# Altium footprint library Electronic Devices_LIB.PcbLib: 410 footprints (part 13 of 26)
Each footprint in its own frame and in the unit in brackets; x right, y up, seen from the top. Pads: shape width x height; smd on the part's side, far side on the other; paste and mask are expansions set on the pad; w line width, h text height; cw(c..) or ccw(c..) is an arc to the next point about the centre after c.
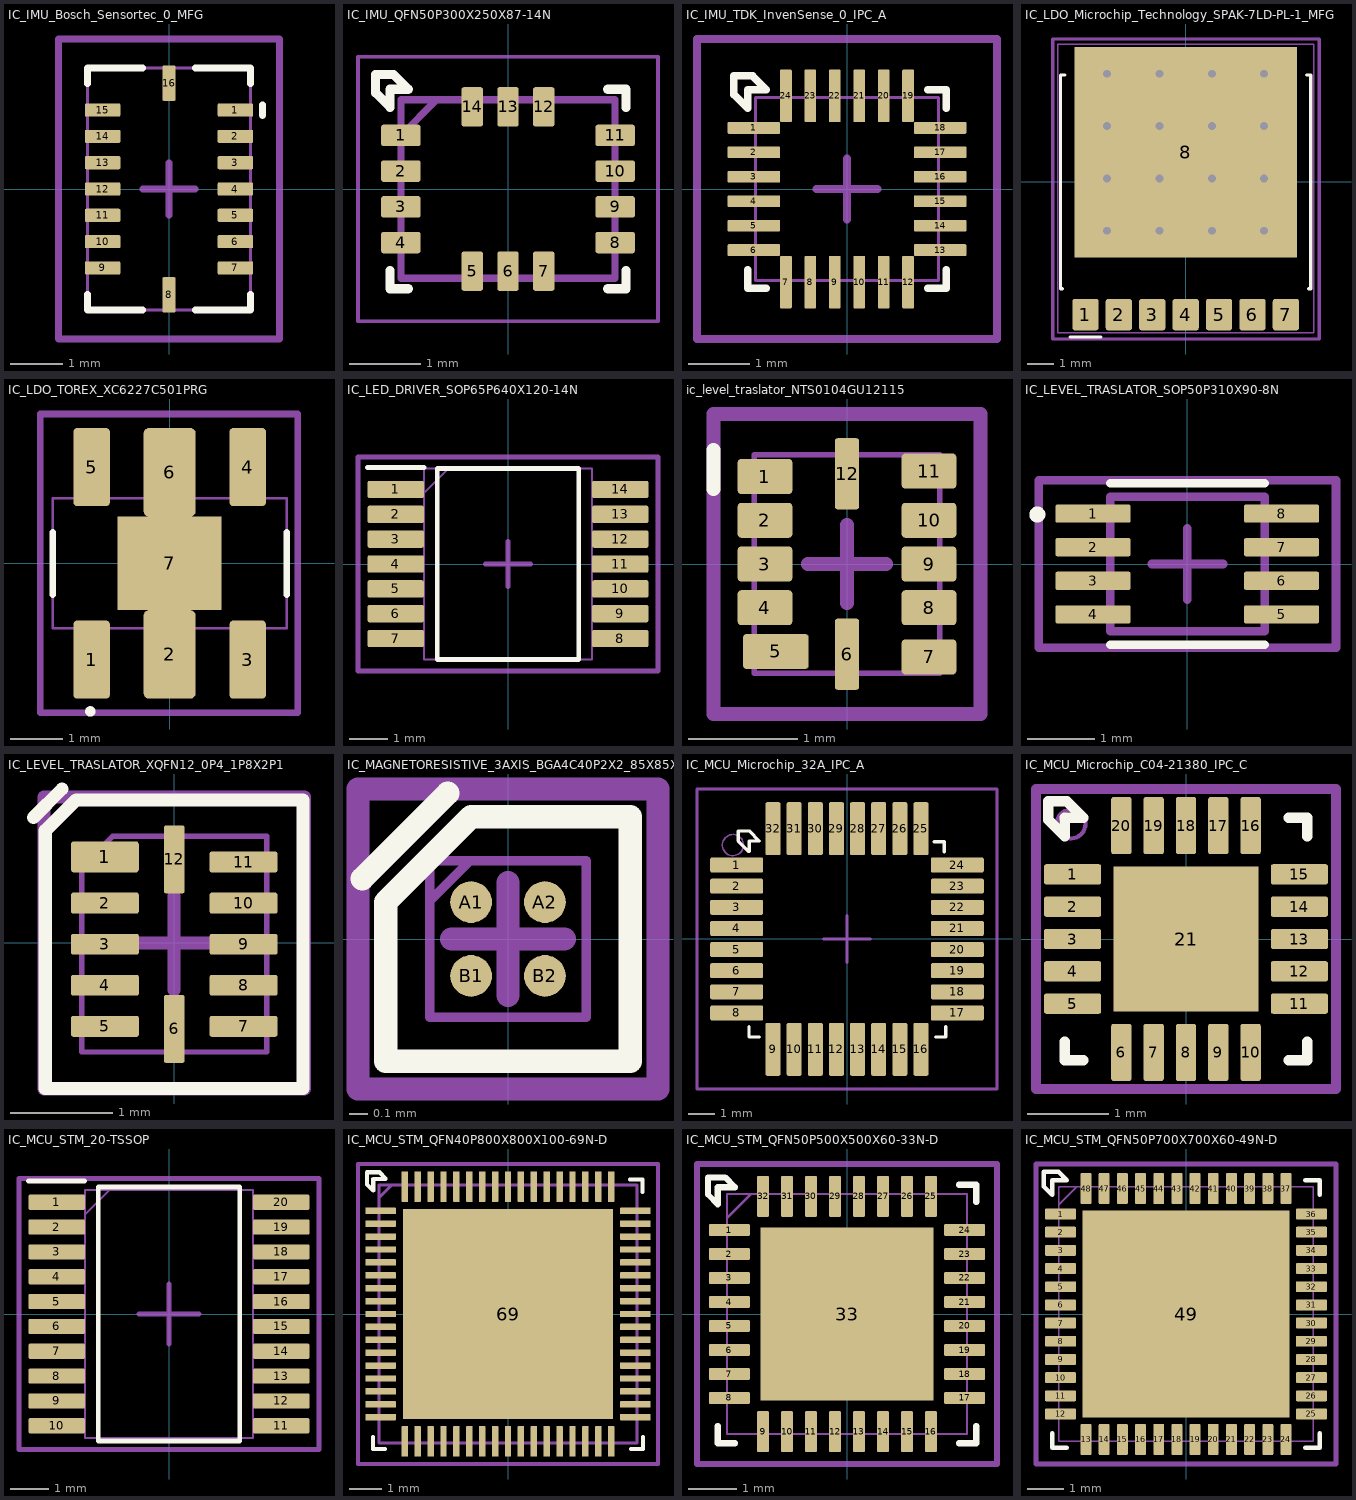
[diagram p12: the footprints below, top view; thin cyan lines are the x and y axes]

## IC_IMU_Bosch_Sensortec_0_MFG [mm] "16-LGA (4.5x3)"
pads (16):
  rrect20% 0.675x0.25 smd paste+0: 1(1.262,1.5) 2(1.262,1) 3(1.262,0.5) 4(1.262,0) 5(1.262,-0.5) 6(1.262,-1) 7(1.262,-1.5) 9(-1.262,-1.5) 10(-1.262,-1) 11(-1.262,-0.5) 12(-1.262,0) 13(-1.262,0.5) 14(-1.262,1) 15(-1.262,1.5)
  rrect20% 0.25x0.675 smd paste+0: 8(0,-2.013) 16(0,2.013)
Top Overlay:
  lines w0.127: -1.55,-2 -1.55,-2.3 -0.5,-2.3 ; -1.55,2 -1.55,2.3 -0.5,2.3 ; 0.5,-2.3 1.55,-2.3 1.55,-2 ; 0.5,2.3 1.55,2.3 1.55,2 ; 1.778,1.397 1.778,1.6
Top Assembly:
  lines w0.051: -1.55,-2.3 -1.55,2.3 1.55,2.3 1.55,-2.3 -1.55,-2.3
  text ".Designator" at -2.362,-0.186 h0.51
Top Courtyard:
  lines w0.127: -0.5,0 0.5,0 ; 0,-0.5 0,0.5 ; -2.1,-2.85 -2.1,2.85 2.1,2.85 2.1,-2.85 -2.1,-2.85
3D body "IC_Bosch_Sensortec_BMI055_eec.STEP": height 0.25, standoff 0, extent -2.1,-2.85 2.1,2.85

## IC_IMU_QFN50P300X250X87-14N [mm] "14-LGA (2.5x3)"
height 0.83
pads (14):
  rrect20% 0.55x0.3 smd mask+0.076: 1(-1.5,0.75) 2(-1.5,0.25) 3(-1.5,-0.25) 4(-1.5,-0.75) 8(1.5,-0.75) 9(1.5,-0.25) 10(1.5,0.25) 11(1.5,0.75)
  rrect20% 0.3x0.55 smd mask+0.076: 5(-0.5,-1.15) 6(0,-1.15) 7(0.5,-1.15) 12(0.5,1.15) 13(0,1.15) 14(-0.5,1.15)
Top Overlay:
  lines w0.127: -1.651,-1.143 -1.651,-1.397 -1.397,-1.397 ; 1.397,-1.397 1.651,-1.397 1.651,-1.143 ; 1.397,1.397 1.651,1.397 1.651,1.143 ; -1.854,1.346 -1.854,1.6 -1.6,1.6 -1.397,1.397 -1.651,1.397 -1.651,1.143 -1.854,1.346
Top 3D Body:
  lines w0.1: -1.5,0.75 -1,1.25 ; -1.5,-1.25 -1.5,1.25 1.5,1.25 1.5,-1.25 -1.5,-1.25
Mechanical 15:
  lines w0.05: -2.1,-1.85 -2.1,1.85 2.1,1.85 2.1,-1.85 -2.1,-1.85
3D body "BMI270.stp": height 0.87, standoff 0, extent -1.55,-1.3 1.55,1.3

## IC_IMU_TDK_InvenSense_0_IPC_A [mm] "QFN 3.0x3.0x0.9"
height 1
pads (24):
  rrect20% 0.861x0.192 smd: 1(-1.526,1) 2(-1.526,0.6) 3(-1.526,0.2) 4(-1.526,-0.2) 5(-1.526,-0.6) 6(-1.526,-1) 13(1.526,-1) 14(1.526,-0.6) 15(1.526,-0.2) 16(1.526,0.2) 17(1.526,0.6) 18(1.526,1)
  rrect20% 0.192x0.861 smd: 7(-1,-1.526) 8(-0.6,-1.526) 9(-0.2,-1.526) 10(0.2,-1.526) 11(0.6,-1.526) 12(1,-1.526) 19(1,1.526) 20(0.6,1.526) 21(0.2,1.526) 22(-0.2,1.526) 23(-0.6,1.526) 24(-1,1.526)
Top Overlay:
  lines w0.127: -1.626,-1.321 -1.626,-1.626 -1.321,-1.626 ; 1.321,-1.626 1.626,-1.626 1.626,-1.321 ; 1.321,1.626 1.626,1.626 1.626,1.321 ; -1.854,1.549 -1.854,1.854 -1.549,1.854 -1.321,1.626 -1.626,1.626 -1.626,1.321 -1.854,1.549
Top Assembly:
  lines w0.051: -1.5,-1.5 1.5,-1.5 1.5,1.5 -1.5,1.5 -1.5,-1.5
  text ".Designator" at -2.667,-0.009 h0.51
Top Courtyard:
  lines w0.127: -0.5,0 0.5,0 ; 0,-0.5 0,0.5 ; -2.456,-2.456 -2.456,2.456 2.456,2.456 2.456,-2.456 -2.456,-2.456
3D body "IC_TDK_InvenSense_ICM-20948_eec.STEP": height 0.25, standoff 0, extent -2.456,-2.456 2.456,2.456

## IC_LDO_Microchip_Technology_SPAK-7LD-PL-1_MFG [mm]
pads (8):
  rrect20% 1x1.2 smd paste+0: 1(-3.81,-5.04) 2(-2.54,-5.04) 3(-1.27,-5.04) 4(0,-5.04) 5(1.27,-5.04) 6(2.54,-5.04) 7(3.81,-5.04)
  rect 8.45x8 smd paste-1000 mask+0: 8(0,1.13)
via -2.985,4.115 diameter 0.6 hole 0.3
via -0.995,4.115 diameter 0.6 hole 0.3
via 0.995,4.115 diameter 0.6 hole 0.3
via 2.985,4.115 diameter 0.6 hole 0.3
via -2.985,2.125 diameter 0.6 hole 0.3
via -0.995,2.125 diameter 0.6 hole 0.3
via 0.995,2.125 diameter 0.6 hole 0.3
via 2.985,2.125 diameter 0.6 hole 0.3
via -2.985,0.135 diameter 0.6 hole 0.3
via -0.995,0.135 diameter 0.6 hole 0.3
via 0.995,0.135 diameter 0.6 hole 0.3
via 2.985,0.135 diameter 0.6 hole 0.3
via -2.985,-1.855 diameter 0.6 hole 0.3
via -0.995,-1.855 diameter 0.6 hole 0.3
via 0.995,-1.855 diameter 0.6 hole 0.3
via 2.985,-1.855 diameter 0.6 hole 0.3
Top Overlay:
  lines w0.127: -4.685,-4.065 -4.76,-4.065 -4.76,4.065 -4.6,4.065 ; -4.394,-5.893 -3.226,-5.893 ; 4.6,4.065 4.76,4.065 4.76,-4.065 4.685,-4.065
Top Paste:
  rectangle: -3.735,3.365 -2.235,4.865
  rectangle: -1.745,3.365 -0.245,4.865
  rectangle: 0.245,3.365 1.745,4.865
  rectangle: 2.235,3.365 3.735,4.865
  rectangle: -3.735,1.375 -2.235,2.875
  rectangle: -1.745,1.375 -0.245,2.875
  rectangle: 0.245,1.375 1.745,2.875
  rectangle: 2.235,1.375 3.735,2.875
  rectangle: -3.735,-0.615 -2.235,0.885
  rectangle: -1.745,-0.615 -0.245,0.885
  rectangle: 0.245,-0.615 1.745,0.885
  rectangle: 2.235,-0.615 3.735,0.885
  rectangle: -3.735,-2.605 -2.235,-1.105
  rectangle: -1.745,-2.605 -0.245,-1.105
  rectangle: 0.245,-2.605 1.745,-1.105
  rectangle: 2.235,-2.605 3.735,-1.105
Top Assembly:
  lines w0.051: -4.86,-5.74 4.86,-5.74 4.86,5.23 -4.86,5.23 -4.86,-5.74
  text ".Designator" at -2.54,-0.212 h0.51
Top Courtyard:
  lines w0.127: -0.5,0 0.5,0 ; 0,-0.5 0,0.5 ; -5.055,-5.969 5.08,-5.969 5.08,5.436 -5.055,5.436 -5.055,-5.969
3D body "IC_Microchip_Technology_MIC69502WR-TR_eec.STEP": height 0.25, standoff 0, extent -4.86,-5.74 4.86,5.23

## IC_LDO_TOREX_XC6227C501PRG [mm]
pads (7):
  rrect20% 0.7x1.5 smd: 1(-1.5,-1.85) 3(1.5,-1.85) 4(1.5,1.85) 5(-1.5,1.85)
  rrect20% 1x1.7 smd: 2(0,-1.75) 6(0,1.75)
  rect 2x1.8 smd: 7(0,0)
Top Overlay:
  lines w0.1: -1.574,-2.845 ccw(c-1.524,-2.845) -1.474,-2.845 ccw(c-1.524,-2.845) -1.574,-2.845
  lines w0.127: -2.25,-0.6 -2.25,0.6 ; 2.25,-0.6 2.25,0.6
Mechanical 1:
  text ".Designator" at -2.515,-0.059 h0.51
Top Assembly:
  lines w0.051: -2.25,-1.25 2.25,-1.25 2.25,1.25 -2.25,1.25 -2.25,-1.25
Top Courtyard:
  lines w0.127: -0.813,0 0,0 ; 0,-0.813 0,0 ; 0,0.813 0,0 ; 0.813,0 0,0 ; -2.489,-2.87 2.464,-2.87 2.464,2.87 -2.489,2.87 -2.489,-2.87
3D body "XC6227C331PR-G.stp": height 1.7, standoff 0, extent -2.25,-1.25 2.25,1.25

## IC_LED_DRIVER_SOP65P640X120-14N [mm] "14-TSSOP (0.173\", 4.40mm Width)"
height 0.34
pads (14):
  rrect20% 1.475x0.45 smd mask+0.076: 1(-2.938,1.95) 2(-2.938,1.3) 3(-2.938,0.65) 4(-2.938,0) 5(-2.938,-0.65) 6(-2.938,-1.3) 7(-2.938,-1.95) 8(2.938,-1.95) 9(2.938,-1.3) 10(2.938,-0.65) 11(2.938,0) 12(2.938,0.65) 13(2.938,1.3) 14(2.938,1.95)
Top Overlay:
  lines w0.127: -3.675,2.525 -2.2,2.525 ; -1.85,-2.5 -1.85,2.5 1.85,2.5 1.85,-2.5 -1.85,-2.5
Top Assembly:
  lines w0.051: -2.2,1.85 -1.55,2.5 ; -2.2,-2.5 -2.2,2.5 2.2,2.5 2.2,-2.5 -2.2,-2.5
  text ".Designator" at -2.54,-0.288 h0.51
Top Courtyard:
  lines w0.127: -0.584,0 0,0 ; 0,-0.584 0,0 ; 0,0.584 0,0 ; 0.584,0 0,0 ; -3.925,-2.8 -3.925,2.8 3.925,2.8 3.925,-2.8 -3.925,-2.8
3D body "TCA6507PWR.stp": height 1.2, standoff 0, extent -3.2,-2.5 3.2,2.5

## ic_level_traslator_NTS0104GU12115 [mm] "12-XQFN (2x1.7)"
height 1.1
pads (12):
  rrect20% 0.5x0.32 smd: 1(-0.75,0.8) 2(-0.75,0.4) 3(-0.75,0) 4(-0.75,-0.4) 7(0.75,-0.85) 8(0.75,-0.4) 9(0.75,0) 10(0.75,0.4) 11(0.75,0.85)
  rrect20% 0.6x0.32 smd: 5(-0.65,-0.8)
  rrect20% 0.22x0.65 smd: 6(0,-0.825) 12(0,0.825)
Top Overlay:
  lines w0.127: -1.219,0.686 -1.219,1.041
Top Assembly:
  lines w0.051: -0.85,-1 0.85,-1 0.85,1 -0.85,1 -0.85,-1
Top Courtyard:
  lines w0.127: -0.356,0 0,0 ; 0,-0.356 0,0 ; 0,0.356 0,0 ; 0.356,0 0,0 ; -1.219,-1.372 1.219,-1.372 1.219,1.372 -1.219,1.372 -1.219,-1.372
3D body "XQFN12_SOT1174-1_NXP.step": height 0.51, standoff 0, extent -0.902,-1.054 0.902,1.054

## IC_LEVEL_TRASLATOR_SOP50P310X90-8N [mm]
pads (8):
  rrect20% 1.12x0.27 smd: 1(-1.405,0.75) 2(-1.405,0.25) 3(-1.405,-0.25) 4(-1.405,-0.75) 5(1.405,-0.75) 6(1.405,-0.25) 7(1.405,0.25) 8(1.405,0.75)
Top Overlay:
  circle w0.2: c-2.235,0.737 r0.019
  lines w0.127: -1.15,-1.205 1.15,-1.205 ; -1.15,1.205 1.15,1.205
Top Assembly:
  text ".Designator" at -2.54,-0.161 h0.51
Top Courtyard:
  lines w0.127: -0.533,0 0,0 ; 0,-0.533 0,0 ; 0,0.533 0,0 ; 0.533,0 0,0 ; -2.215,-1.25 -2.215,1.25 2.215,1.25 2.215,-1.25 -2.215,-1.25
Top 3D Body:
  lines w0.127: -1.15,-1 -1.15,1 1.15,1 1.15,-1 -1.15,-1
3D body "step_temp.STEP": height 0.9, standoff 0, extent -1.55,-1 1.55,1

## IC_LEVEL_TRASLATOR_XQFN12_0P4_1P8X2P1 [mil] "XQFN12_0P4_1P8X2P1"
height 43.31
pads (12):
  rrect20% 26x12 smd: 1(-26.57,32.97)
  rrect20% 26x8 smd: 2(-26.57,15.26) 3(-26.57,-0.49) 4(-26.57,-16.24) 5(-26.57,-31.99) 7(26.57,-31.99) 8(26.57,-16.24) 9(26.57,-0.49) 10(26.57,15.26) 11(26.57,31.01)
  rrect20% 8x26 smd: 6(0,-32.97) 12(0,31.99)
Top Overlay:
  lines w5: -54,48 -43,59 ; -49.43,-55.83 -49.43,43.04 -37.62,54.85 49.43,54.85 49.43,-55.83 -49.43,-55.83
Top Assembly:
  lines w2: -35.43,-41.83 -35.43,29.04 -23.62,40.85 35.43,40.85 35.43,-41.83 -35.43,-41.83
  text ".Designator" at -103,-5.34 h20
Top Courtyard:
  lines w5: -50,55 -50,-56 50,-56 50,56 -50,56 ; -18,0 0,0 ; 0,-18 0,0 ; 0,18 0,0 ; 18,0 0,0
3D body "XQFN12_SOT1174-1_NXP.step": height 20.12, standoff 0, extent -35.51,-41.5 35.51,41.5

## IC_MAGNETORESISTIVE_3AXIS_BGA4C40P2X2_85X85X60 [mm]
pads (4):
  round 0.226 smd: A1(-0.2,0.2) A2(0.2,0.2) B1(-0.2,-0.2) B2(0.2,-0.2)
Top Overlay:
  lines w0.127: -0.79,0.327 -0.327,0.79 ; -0.663,-0.663 0.663,-0.663 0.663,0.663 -0.2,0.663 -0.663,0.2 -0.663,-0.663
Top Assembly:
  lines w0.051: -0.425,0.205 -0.205,0.425 ; -0.425,-0.425 -0.425,0.425 0.425,0.425 0.425,-0.425 -0.425,-0.425
  text ".Designator" at -2.667,-0.161 h0.51
Top Courtyard:
  lines w0.127: -0.305,0 0,0 ; 0,-0.305 0,0 ; 0,0.305 0,0 ; 0.305,0 0,0 ; -0.813,-0.813 0.813,-0.813 0.813,0.813 -0.813,0.813 -0.813,-0.813
3D body "MMC5633NJL.stp": height 0.6, standoff 0, extent -0.425,-0.425 0.425,0.425

## IC_MCU_Microchip_32A_IPC_A [mm] "7x7x1.0 mm Body, 2.00 mm (TQFN)"
height 1.2
pads (32):
  rrect20% 2.004x0.566 smd paste+0: 1(-4.175,2.8) 2(-4.175,2) 3(-4.175,1.2) 4(-4.175,0.4) 5(-4.175,-0.4) 6(-4.175,-1.2) 7(-4.175,-2) 8(-4.175,-2.8) 17(4.175,-2.8) 18(4.175,-2) 19(4.175,-1.2) 20(4.175,-0.4) 21(4.175,0.4) 22(4.175,1.2) 23(4.175,2) 24(4.175,2.8)
  rrect20% 0.566x2.004 smd paste+0: 9(-2.8,-4.175) 10(-2,-4.175) 11(-1.2,-4.175) 12(-0.4,-4.175) 13(0.4,-4.175) 14(1.2,-4.175) 15(2,-4.175) 16(2.8,-4.175) 25(2.8,4.175) 26(2,4.175) 27(1.2,4.175) 28(0.4,4.175) 29(-0.4,4.175) 30(-1.2,4.175) 31(-2,4.175) 32(-2.8,4.175)
Top Overlay:
  lines w0.127: -3.708,-3.327 -3.708,-3.708 -3.327,-3.708 ; 3.302,3.683 3.683,3.683 3.683,3.302 ; 3.353,-3.708 3.734,-3.708 3.734,-3.327 ; -4.115,3.708 -4.115,4.089 -3.734,4.089 -3.696,4.089 -3.315,3.708 -3.696,3.708 -3.696,3.327 -3.734,3.327 -4.115,3.708
Top Assembly:
  circle w0.051: c-4.318,3.556 r0.402
  lines w0.051: -5.677,-5.677 5.677,-5.677 5.677,5.677 -5.677,5.677 -5.677,-5.677
  text ".Designator" at -2.489,-0.161 h0.51
Top Courtyard:
  lines w0.127: -0.889,0 0,0 ; 0,-0.889 0,0 ; 0,0.889 0,0 ; 0.889,0 0,0 ; -5.677,-5.677 5.677,-5.677 5.677,5.677 -5.677,5.677 -5.677,-5.677
3D body "IC_Microchip_ATMEGA168PB-AU_eec.STEP": height 0.25, standoff 0, extent -5.677,-5.677 5.677,5.677

## IC_MCU_Microchip_C04-21380_IPC_C [mm] "20-vqfn"
height 0.9
pads (21):
  rrect20% 0.706x0.25 smd paste+0 mask+0.076: 1(-1.403,0.8) 2(-1.403,0.4) 3(-1.403,0) 4(-1.403,-0.4) 5(-1.403,-0.8) 11(1.403,-0.8) 12(1.403,-0.4) 13(1.403,0) 14(1.403,0.4) 15(1.403,0.8)
  rrect20% 0.25x0.706 smd paste+0 mask+0.076: 6(-0.8,-1.403) 7(-0.4,-1.403) 8(0,-1.403) 9(0.4,-1.403) 10(0.8,-1.403) 16(0.8,1.403) 17(0.4,1.403) 18(0,1.403) 19(-0.4,1.403) 20(-0.8,1.403)
  rect 1.8x1.8 smd paste-1000 mask+0: 21(0,0)
Top Overlay:
  lines w0.127: -1.5,-1.271 -1.5,-1.5 -1.271,-1.5 ; 1.271,-1.5 1.5,-1.5 1.5,-1.271 ; 1.271,1.5 1.5,1.5 1.5,1.271 ; -1.703,1.475 -1.5,1.271 -1.5,1.5 -1.271,1.5 -1.475,1.703 -1.703,1.703 -1.703,1.474
Top Paste:
  rectangle: -0.569,-0.569 0.569,0.569
Top Assembly:
  circle w0.051: c-1.422,1.422 r0.178
  lines w0.051: -1.856,-1.856 -1.856,1.856 1.856,1.856 1.856,-1.856 -1.856,-1.856
  text ".Designator" at -2.616,-0.288 h0.51
Top Courtyard:
  lines w0.127: -0.508,0 0,0 ; 0,-0.508 0,0 ; 0,0.508 0,0 ; 0.508,0 0,0 ; -1.856,-1.856 -1.856,1.856 1.856,1.856 1.856,-1.856 -1.856,-1.856
3D body "IC_Microchip_ATTINY1616-MNR_eec.STEP": height 0.25, standoff 0, extent -1.856,-1.856 1.856,1.856

## IC_MCU_STM_20-TSSOP [mm] "20-TSSOP  (0.173\", 4.40mm Width) Pitch 0.65mm"
height 1.2
pads (20):
  rrect20% 1.475x0.4 smd: 1(-2.938,2.925) 2(-2.938,2.275) 3(-2.938,1.625) 4(-2.938,0.975) 5(-2.938,0.325) 6(-2.938,-0.325) 7(-2.938,-0.975) 8(-2.938,-1.625) 9(-2.938,-2.275) 10(-2.938,-2.925) 11(2.938,-2.925) 12(2.938,-2.275) 13(2.938,-1.625) 14(2.938,-0.975) 15(2.938,-0.325) 16(2.938,0.325) 17(2.938,0.975) 18(2.938,1.625) 19(2.938,2.275) 20(2.938,2.925)
Top Overlay:
  lines w0.127: -3.683,3.48 -2.21,3.48 ; -1.85,-3.327 -1.85,3.327 -0.925,3.327 0.925,3.327 1.85,3.327 1.85,-3.327 -1.85,-3.327
Top Assembly:
  lines w0.051: -2.2,2.6 -1.55,3.25 ; -2.2,-3.25 2.2,-3.25 2.2,3.25 -2.2,3.25 -2.2,-3.25
  text ".Designator" at -2.438,-0.288 h0.51
Top Courtyard:
  lines w0.127: -0.787,0 0,0 ; 0,-0.787 0,0 ; 0,0.787 0,0 ; 0.787,0 0,0 ; -3.925,-3.55 3.925,-3.55 3.925,3.55 -3.925,3.55 -3.925,-3.55
3D body "STM32F030F4P6TR.stp": height 1.2, standoff 0, extent -3.2,-3.25 3.2,3.25

## IC_MCU_STM_QFN40P800X800X100-69N-D [mm]
pads (69):
  rrect20% 0.95x0.2 smd: 1(-3.95,3.2) 2(-3.95,2.8) 3(-3.95,2.4) 4(-3.95,2) 5(-3.95,1.6) 6(-3.95,1.2) 7(-3.95,0.8) 8(-3.95,0.4) 9(-3.95,0) 10(-3.95,-0.4) 11(-3.95,-0.8) 12(-3.95,-1.2) 13(-3.95,-1.6) 14(-3.95,-2) 15(-3.95,-2.4) 16(-3.95,-2.8) 17(-3.95,-3.2) 35(3.95,-3.2) 36(3.95,-2.8) 37(3.95,-2.4) 38(3.95,-2) 39(3.95,-1.6) 40(3.95,-1.2) 41(3.95,-0.8) 42(3.95,-0.4) 43(3.95,0) 44(3.95,0.4) 45(3.95,0.8) 46(3.95,1.2) 47(3.95,1.6) 48(3.95,2) 49(3.95,2.4) 50(3.95,2.8) 51(3.95,3.2)
  rrect20% 0.2x0.95 smd: 18(-3.2,-3.95) 19(-2.8,-3.95) 20(-2.4,-3.95) 21(-2,-3.95) 22(-1.6,-3.95) 23(-1.2,-3.95) 24(-0.8,-3.95) 25(-0.4,-3.95) 26(0,-3.95) 27(0.4,-3.95) 28(0.8,-3.95) 29(1.2,-3.95) 30(1.6,-3.95) 31(2,-3.95) 32(2.4,-3.95) 33(2.8,-3.95) 34(3.2,-3.95) 52(3.2,3.95) 53(2.8,3.95) 54(2.4,3.95) 55(2,3.95) 56(1.6,3.95) 57(1.2,3.95) 58(0.8,3.95) 59(0.4,3.95) 60(0,3.95) 61(-0.4,3.95) 62(-0.8,3.95) 63(-1.2,3.95) 64(-1.6,3.95) 65(-2,3.95) 66(-2.4,3.95) 67(-2.8,3.95) 68(-3.2,3.95)
  rect 6.5x6.5 smd: 69(0,0)
Top Overlay:
  lines w0.127: -4.191,-3.81 -4.191,-4.191 -3.81,-4.191 ; 3.785,4.166 4.166,4.166 4.166,3.785 ; 3.81,-4.191 4.191,-4.191 4.191,-3.81 ; -4.369,4.013 -4.369,4.394 -3.988,4.394 -3.797,4.204 -3.797,4.191 -4.178,4.191 -4.178,3.823 -4.369,4.013
Top Assembly:
  text ".Designator" at -2.438,-0.186 h0.51
Top Courtyard:
  lines w0.127: -0.483,0 0,0 ; 0,-0.483 0,0 ; 0,0.483 0,0 ; 0.483,0 0,0 ; -4.65,-4.65 4.65,-4.65 4.65,4.65 -4.65,4.65 -4.65,-4.65
Top 3D Body:
  lines w0.1: -4,3.6 -3.6,4 ; -4,-4 4,-4 4,4 -4,4 -4,-4
3D body "STM32H573RIV6.stp": height 1, standoff 0, extent -4.05,-4.05 4.05,4.05

## IC_MCU_STM_QFN50P500X500X60-33N-D [mm] "32-UFQFPN (5x5)"
height 0.6
pads (33):
  rrect20% 0.85x0.25 smd: 1(-2.45,1.75) 2(-2.45,1.25) 3(-2.45,0.75) 4(-2.45,0.25) 5(-2.45,-0.25) 6(-2.45,-0.75) 7(-2.45,-1.25) 8(-2.45,-1.75) 17(2.45,-1.75) 18(2.45,-1.25) 19(2.45,-0.75) 20(2.45,-0.25) 21(2.45,0.25) 22(2.45,0.75) 23(2.45,1.25) 24(2.45,1.75)
  rrect20% 0.25x0.85 smd: 9(-1.75,-2.45) 10(-1.25,-2.45) 11(-0.75,-2.45) 12(-0.25,-2.45) 13(0.25,-2.45) 14(0.75,-2.45) 15(1.25,-2.45) 16(1.75,-2.45) 25(1.75,2.45) 26(1.25,2.45) 27(0.75,2.45) 28(0.25,2.45) 29(-0.25,2.45) 30(-0.75,2.45) 31(-1.25,2.45) 32(-1.75,2.45)
  rect 3.6x3.6 smd: 33(0,0)
Top Overlay:
  lines w0.127: -2.692,-2.337 -2.692,-2.692 -2.337,-2.692 ; 2.337,-2.692 2.692,-2.692 2.692,-2.337 ; 2.337,2.692 2.692,2.692 2.692,2.337 ; -2.896,2.489 -2.896,2.845 -2.54,2.845 -2.337,2.642 -2.692,2.642 -2.692,2.286 -2.896,2.489
Top Assembly:
  lines w0.051: -2.5,2 -2,2.5 ; -2.5,-2.5 -2.5,2.5 2.5,2.5 2.5,-2.5 -2.5,-2.5
  text ".Designator" at -2.616,0.093 h0.51
Top Courtyard:
  lines w0.127: -0.66,0 0,0 ; 0,-0.66 0,0 ; 0,0.66 0,0 ; 0.66,0 0,0 ; -3.125,-3.125 -3.125,3.125 3.125,3.125 3.125,-3.125 -3.125,-3.125
3D body "STM32L432KBU6.stp": height 0.6, standoff 0, extent -2.55,-2.55 2.55,2.55

## IC_MCU_STM_QFN50P700X700X60-49N-D [mm] "48-UFQFPN (7x7), 0.5mm Pitch"
height 0.6
pads (49):
  rrect20% 0.85x0.3 smd mask+0.076: 1(-3.45,2.75) 2(-3.45,2.25) 3(-3.45,1.75) 4(-3.45,1.25) 5(-3.45,0.75) 6(-3.45,0.25) 7(-3.45,-0.25) 8(-3.45,-0.75) 9(-3.45,-1.25) 10(-3.45,-1.75) 11(-3.45,-2.25) 12(-3.45,-2.75) 25(3.45,-2.75) 26(3.45,-2.25) 27(3.45,-1.75) 28(3.45,-1.25) 29(3.45,-0.75) 30(3.45,-0.25) 31(3.45,0.25) 32(3.45,0.75) 33(3.45,1.25) 34(3.45,1.75) 35(3.45,2.25) 36(3.45,2.75)
  rrect20% 0.3x0.85 smd mask+0.076: 13(-2.75,-3.45) 14(-2.25,-3.45) 15(-1.75,-3.45) 16(-1.25,-3.45) 17(-0.75,-3.45) 18(-0.25,-3.45) 19(0.25,-3.45) 20(0.75,-3.45) 21(1.25,-3.45) 22(1.75,-3.45) 23(2.25,-3.45) 24(2.75,-3.45) 37(2.75,3.45) 38(2.25,3.45) 39(1.75,3.45) 40(1.25,3.45) 41(0.75,3.45) 42(0.25,3.45) 43(-0.25,3.45) 44(-0.75,3.45) 45(-1.25,3.45) 46(-1.75,3.45) 47(-2.25,3.45) 48(-2.75,3.45)
  rect 5.7x5.7 smd: 49(0,0)
Top Overlay:
  lines w0.127: -3.683,-3.277 -3.683,-3.683 -3.277,-3.683 ; 3.277,-3.683 3.683,-3.683 3.683,-3.277 ; 3.277,3.683 3.683,3.683 3.683,3.277 ; -3.912,3.505 -3.912,3.912 -3.505,3.912 -3.277,3.683 -3.683,3.683 -3.683,3.277 -3.912,3.505
Top Assembly:
  lines w0.051: -3.5,3 -3,3.5 ; -3.5,-3.5 3.5,-3.5 3.5,3.5 -3.5,3.5 -3.5,-3.5
  text ".Designator" at -2.515,-0.161 h0.51
Top Courtyard:
  lines w0.127: -0.66,0 0,0 ; 0,-0.66 0,0 ; 0,0.66 0,0 ; 0.66,0 0,0 ; -4.125,-4.125 4.125,-4.125 4.125,4.125 -4.125,4.125 -4.125,-4.125
3D body "STM32WB55CGU7.stp": height 0.6, standoff 0, extent -3.55,-3.55 3.55,3.55